# Altium footprint library Sajad_Altium_Library.PcbLib: 333 footprints (part 14 of 21)
Each footprint in its own frame and in the unit in brackets; x right, y up, seen from the top. Pads: shape width x height; smd on the part's side, far side on the other; paste and mask are expansions set on the pad; w line width, h text height; cw(c..) or ccw(c..) is an arc to the next point about the centre after c.
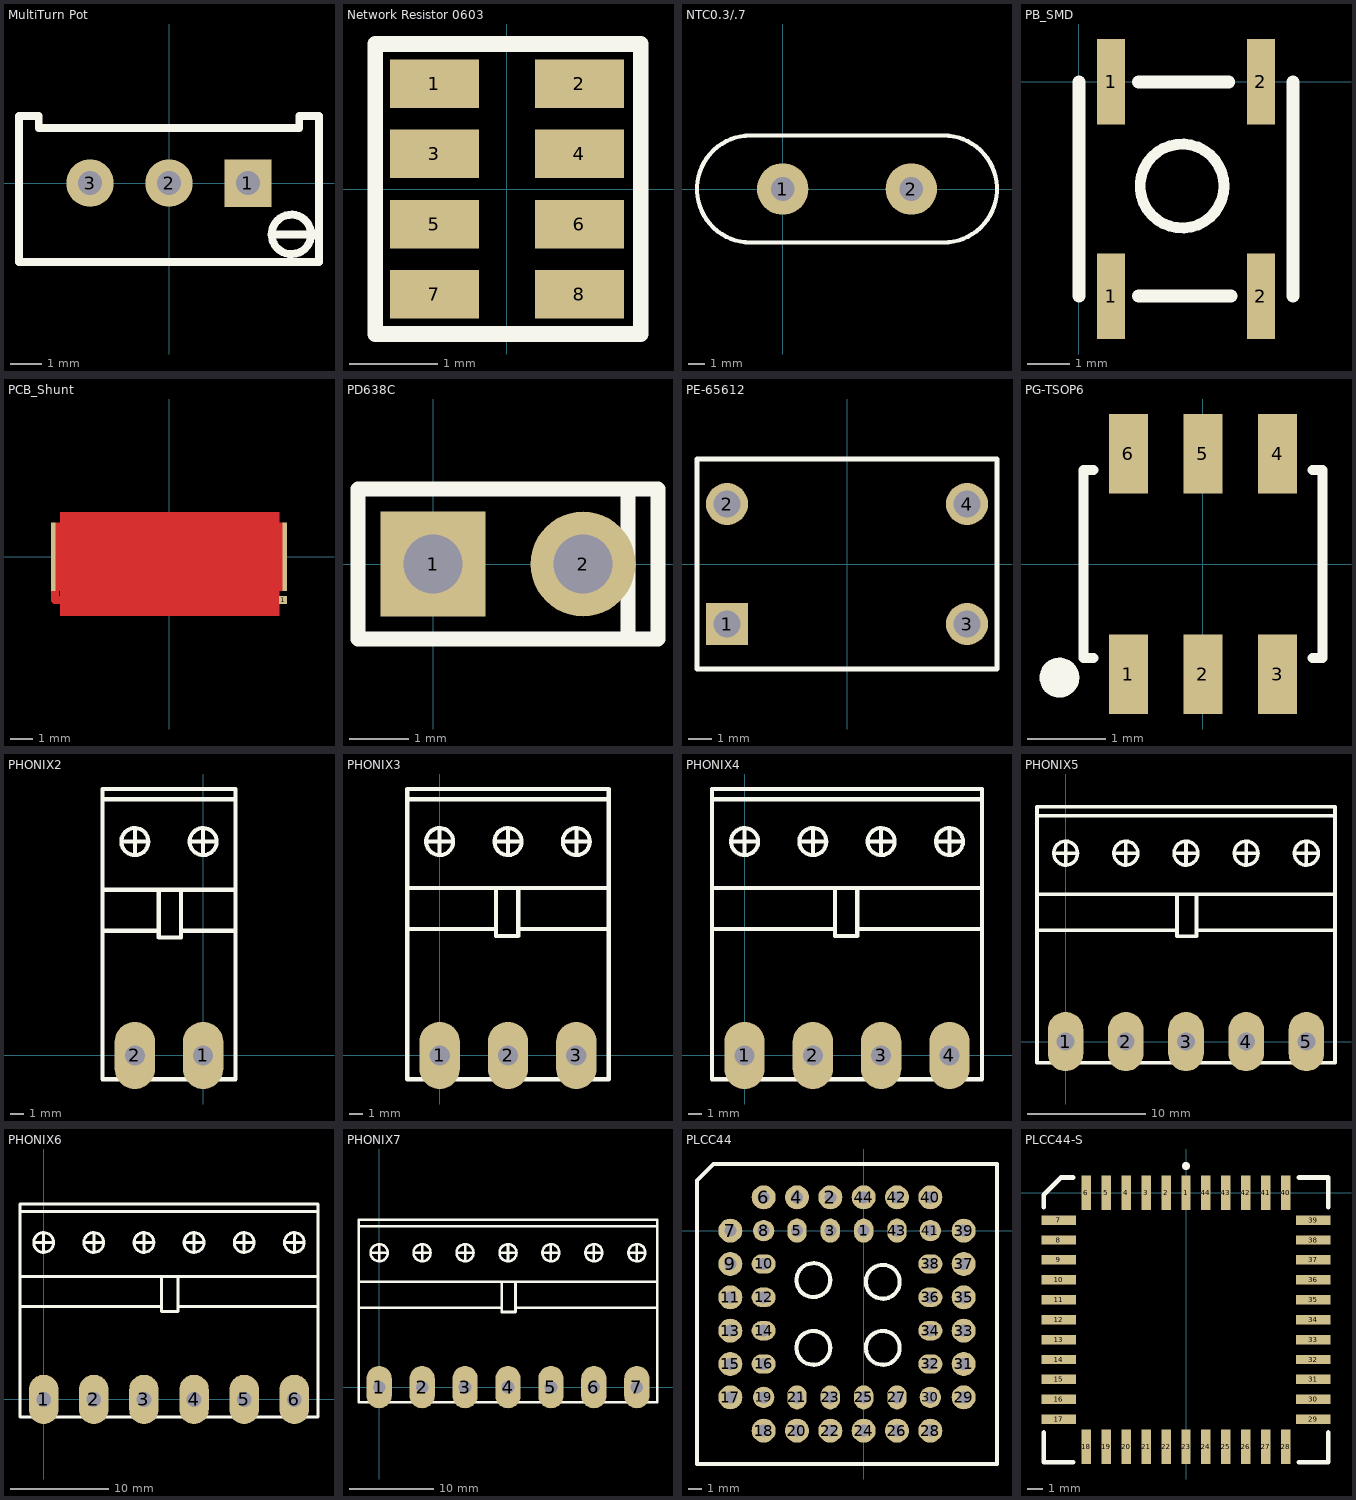
[diagram p13: the footprints below, top view; thin cyan lines are the x and y axes]

## MultiTurn Pot [mil] "MultiTurn Potentiometer"
pads (3):
  rect 60x60 hole 30: 1(100,0)
  round 60 hole 30: 2(0,0) 3(-100,0)
Top Overlay:
  circle w10: c155,-65 r25
  lines w10: 130,-65 175,-65 ; -190,-100 -190,85 -165,85 -165,70 0,70 165,70 165,85 190,85 190,-100 -190,-100
3D body: height 454.72, standoff -251.97, extent -187.6,-100.2 187.6,90

## Network Resistor 0603 [mm]
pads (8):
  rect 1.016x0.55 smd: 1(-0.825,1.2) 2(0.826,1.2) 3(-0.825,0.4) 4(0.826,0.4) 5(-0.825,-0.4) 6(0.826,-0.4) 7(-0.825,-1.2) 8(0.826,-1.2)
Top Overlay:
  lines w0.178: -1.499,-1.651 -1.499,1.651 1.524,1.651 1.524,-1.651 -1.499,-1.651
3D body: height 0.55, standoff 0, extent -0.8,-1.651 0.8,1.549

## NTC0.3/.7 [mil]
pads (2):
  round 120 hole 55: 1(0,0) 2(300,0)
Top Overlay:
  lines w10: -75,-125 cw(c-75,0) -75,125 375,125 cw(c375,0) 375,-125 -75,-125

## PB_SMD [mm]
pads (4):
  rect 0.65x2 smd: 1(0.75,-5) 1(0.75,0) 2(4.25,-5) 2(4.25,0)
Top Overlay:
  circle w0.254: c2.408,-2.431 r0.979
  lines w0.3: 0,-5 0,0 ; 1.393,-5 3.551,-5 ; 1.393,0 3.496,0 ; 5,-5 5,0

## PCB_Shunt [mm] "3miliOhm"
pads (3):
  rect 0.2x3 smd paste-0.1 mask-0.1: 1(-5.08,0) 2(5.08,0)
  rect 0.356x0.356 smd paste-0.1 mask-0.1: 1(5.002,-1.905)
Top Layer:
  rectangle: -5.004,-1.499 4.996,1.501
  pour cut-out: -4.775,1.956 -4.775,-2.591 4.839,-2.591 4.839,1.956
  lines w0.356: -5.004,-1.499 -5.004,-1.905 4.826,-1.905

## PD638C [mil] "2.75 ×5.25 mm Silicon PIN Photodiode"
pads (2):
  rect 70x70 hole 39.37: 1(0,0)
  round 70 hole 39.37: 2(100,0)
Top Overlay:
  lines w10: 130,-50 130,50 ; -50,-50 150,-50 150,50 -50,50 -50,-50
3D body: height 350, standoff -350, extent -42.4,-65 132.4,57.64

## PE-65612 [mil] "TRANSFORMERS FOR DIGITAL  AUDIO DATA TRANSMISSION"
pads (4):
  rect 70x70 hole 45: 1(-200,-100)
  round 70 hole 45: 2(-200,100) 3(200,-100) 4(200,100)
Top Overlay:
  lines w8: -250,-175 250,-175 250,175 -250,175 -250,-175
3D body: height 307.09, standoff -161.42, extent -250,-200.79 250,200.79

## PG-TSOP6 [mm]
pads (6):
  rect 0.5x1.016 smd: 1(-0.95,-1.403) 2(0,-1.403) 3(0.95,-1.403) 4(0.95,1.403) 5(0,1.403) 6(-0.95,1.403)
Top Overlay:
  circle w0.254: c-1.829,-1.448 r0.127
  lines w0.127: -1.397,-1.2 -1.524,-1.2 -1.524,0 -1.524,1.2 -1.397,1.2 ; 1.397,-1.2 1.524,-1.2 1.524,0 1.524,1.2 1.397,1.2
3D body: height 1.3, standoff 0, extent -1.5,-1.5 1.5,1.5

## PHONIX2 [mm]
pads (2):
  oval 3x5 hole 1.5: 1(0,0) 2(-5.08,0)
Top Overlay:
  circle w0.3: c-5.08,15.9 r1.006
  circle w0.3: c0,15.9 r1.006
  lines w0.3: -7.366,19.05 2.413,19.05 ; -5.944,15.9 -4.242,15.9 ; -5.08,15.062 -5.08,16.688 ; -0.864,15.9 0.838,15.9 ; 0,15.062 0,16.688
  lines w0.305: -7.493,9.271 -3.302,9.271 ; -7.493,12.319 2.413,12.319 ; -3.302,12.192 -3.302,8.763 -1.651,8.763 -1.651,12.319 ; -1.651,9.271 2.413,9.271 ; 2.337,-1.778 -7.493,-1.778 -7.493,19.812 2.413,19.812 2.413,-1.778

## PHONIX3 [mm]
pads (3):
  oval 3x5 hole 1.5: 1(0,0) 2(5.08,0) 3(10.16,0)
Top Overlay:
  circle w0.3: c10.16,15.9 r1.006
  circle w0.3: c0,15.9 r1.006
  circle w0.3: c5.08,15.9 r1.006
  lines w0.3: -2.286,19.05 12.573,19.05 ; -0.864,15.9 0.838,15.9 ; 0,15.062 0,16.688 ; 4.216,15.9 5.918,15.9 ; 5.08,15.062 5.08,16.688 ; 9.296,15.9 10.998,15.9 ; 10.16,15.062 10.16,16.688
  lines w0.305: -2.413,9.398 4.191,9.398 ; -2.413,12.446 12.573,12.446 ; 4.191,12.319 4.191,8.89 5.842,8.89 5.842,12.446 ; 5.842,9.398 12.573,9.398 ; -2.413,-1.778 12.573,-1.778 12.573,19.812 -2.413,19.812 -2.413,-1.778

## PHONIX4 [mm]
pads (4):
  oval 3x5 hole 1.5: 1(0,0) 2(5.08,0) 3(10.16,0) 4(15.24,0)
Top Overlay:
  circle w0.3: c15.24,15.9 r1.006
  circle w0.3: c10.16,15.9 r1.006
  circle w0.3: c0,15.9 r1.006
  circle w0.3: c5.08,15.9 r1.006
  lines w0.3: -2.286,19.05 17.653,19.05 ; -0.864,15.9 0.838,15.9 ; 0,15.062 0,16.688 ; 4.216,15.9 5.918,15.9 ; 5.08,15.062 5.08,16.688 ; 9.296,15.9 10.998,15.9 ; 10.16,15.062 10.16,16.688 ; 14.376,15.9 16.078,15.9 ; 15.24,15.062 15.24,16.688
  lines w0.305: -2.413,9.398 6.731,9.398 ; -2.413,12.446 17.653,12.446 ; 6.731,12.319 6.731,8.89 8.382,8.89 8.382,12.446 ; 8.382,9.398 17.653,9.398 ; -2.413,-1.778 17.653,-1.778 17.653,19.812 -2.413,19.812 -2.413,-1.778

## PHONIX5 [mm]
pads (5):
  oval 3x5 hole 1.5: 1(0,0) 2(5.08,0) 3(10.16,0) 4(15.24,0) 5(20.32,0)
Top Overlay:
  circle w0.3: c15.24,15.9 r1.006
  circle w0.3: c10.16,15.9 r1.006
  circle w0.3: c0,15.9 r1.006
  circle w0.3: c5.08,15.9 r1.006
  circle w0.3: c20.32,15.9 r1.006
  lines w0.3: -2.286,19.05 22.733,19.05 ; -0.864,15.9 0.838,15.9 ; 0,15.062 0,16.688 ; 4.216,15.9 5.918,15.9 ; 5.08,15.062 5.08,16.688 ; 9.296,15.9 10.998,15.9 ; 10.16,15.062 10.16,16.688 ; 14.376,15.9 16.078,15.9 ; 15.24,15.062 15.24,16.688 ; 19.456,15.9 21.158,15.9 ; 20.32,15.062 20.32,16.688
  lines w0.305: -2.413,9.398 9.398,9.398 ; -2.413,12.446 22.733,12.446 ; 9.398,12.319 9.398,8.89 11.049,8.89 11.049,12.446 ; 11.049,9.398 22.733,9.398 ; -2.413,-1.778 22.733,-1.778 22.733,19.812 -2.413,19.812 -2.413,-1.778

## PHONIX6 [mm]
pads (6):
  oval 3x5 hole 1.5: 1(0,0) 2(5.08,0) 3(10.16,0) 4(15.24,0) 5(20.32,0) 6(25.4,0)
Top Overlay:
  circle w0.3: c25.4,15.9 r1.006
  circle w0.3: c20.32,15.9 r1.006
  circle w0.3: c5.08,15.9 r1.006
  circle w0.3: c0,15.9 r1.006
  circle w0.3: c10.16,15.9 r1.006
  circle w0.3: c15.24,15.9 r1.006
  lines w0.3: -2.286,19.05 27.813,19.05 ; -0.864,15.9 0.838,15.9 ; 0,15.062 0,16.688 ; 4.216,15.9 5.918,15.9 ; 5.08,15.062 5.08,16.688 ; 9.296,15.9 10.998,15.9 ; 10.16,15.062 10.16,16.688 ; 14.376,15.9 16.078,15.9 ; 15.24,15.062 15.24,16.688 ; 19.456,15.9 21.158,15.9 ; 20.32,15.062 20.32,16.688 ; 24.536,15.9 26.238,15.9 ; 25.4,15.062 25.4,16.688
  lines w0.305: -2.413,9.398 11.938,9.398 ; -2.413,12.446 27.813,12.446 ; 11.938,12.319 11.938,8.89 13.589,8.89 13.589,12.446 ; 13.589,9.398 27.813,9.398 ; -2.413,-1.778 -2.413,19.812 27.813,19.812 27.813,-1.778 -2.413,-1.778

## PHONIX7 [mm]
pads (7):
  oval 3x5 hole 1.5: 1(0,0) 2(5.08,0) 3(10.16,0) 4(15.24,0) 5(20.32,0) 6(25.4,0) 7(30.48,0)
Top Overlay:
  circle w0.3: c15.24,15.9 r1.006
  circle w0.3: c10.16,15.9 r1.006
  circle w0.3: c0,15.9 r1.006
  circle w0.3: c5.08,15.9 r1.006
  circle w0.3: c20.32,15.9 r1.006
  circle w0.3: c25.4,15.9 r1.006
  circle w0.3: c30.48,15.9 r1.006
  lines w0.3: -2.286,19.05 32.893,19.05 ; -0.864,15.9 0.838,15.9 ; 0,15.062 0,16.688 ; 4.216,15.9 5.918,15.9 ; 5.08,15.062 5.08,16.688 ; 9.296,15.9 10.998,15.9 ; 10.16,15.062 10.16,16.688 ; 14.376,15.9 16.078,15.9 ; 15.24,15.062 15.24,16.688 ; 19.456,15.9 21.158,15.9 ; 20.32,15.062 20.32,16.688 ; 24.536,15.9 26.238,15.9 ; 25.4,15.062 25.4,16.688 ; 29.616,15.9 31.318,15.9 ; 30.48,15.062 30.48,16.688
  lines w0.305: -2.413,12.446 32.766,12.446 ; -2.286,9.398 14.478,9.398 ; 14.478,12.319 14.478,8.89 16.129,8.89 16.129,12.446 ; 16.129,9.398 32.893,9.398 ; -2.413,-1.778 32.893,-1.778 32.893,19.812 -2.413,19.812 -2.413,-1.778

## PLCC44 [mm]
pads (44):
  oval 1.45x1.8 hole 0.9: 1(0,0) 3(-2.5,0) 5(-5,0) 21(-5,-12.5) 23(-2.5,-12.5) 25(0,-12.5) 27(2.5,-12.5) 43(2.5,0)
  round 1.8 hole 0.9: 2(-2.5,2.5) 4(-5,2.5) 6(-7.5,2.5) 7(-10,0) 9(-10,-2.5) 11(-10,-5) 13(-10,-7.5) 15(-10,-10) 17(-10,-12.5) 18(-7.5,-15) 20(-5,-15) 22(-2.5,-15) 24(0,-15) 26(2.5,-15) 28(5,-15) 29(7.5,-12.5) 31(7.5,-10) 33(7.5,-7.5) 35(7.5,-5) 37(7.5,-2.5) 39(7.5,0) 40(5,2.5) 42(2.5,2.5) 44(0,2.5)
  round 1.6 hole 0.9: 8(-7.5,0) 19(-7.5,-12.5) 30(5,-12.5) 41(5,0)
  oval 1.8x1.45 hole 0.9: 10(-7.5,-2.5) 12(-7.5,-5) 14(-7.5,-7.5) 16(-7.5,-10) 32(5,-10) 34(5,-7.5) 36(5,-5) 38(5,-2.5)
Top Overlay:
  circle w0.305: c1.433,-8.789 r1.27
  circle w0.305: c-3.774,-8.789 r1.27
  circle w0.305: c1.433,-3.836 r1.27
  circle w0.305: c-3.774,-3.709 r1.27
  lines w0.305: -12.5,-17.5 10,-17.5 10,5 -11.25,5 -12.5,3.75 -12.5,-17.5

## PLCC44-S [mm]
pads (44):
  rect 0.6x2.2 smd: 1(0,0) 2(-1.27,0) 3(-2.54,0) 4(-3.81,0) 5(-5.08,0) 6(-6.35,0) 18(-6.35,-16.2) 19(-5.08,-16.2) 20(-3.81,-16.2) 21(-2.54,-16.2) 22(-1.27,-16.2) 23(0,-16.2) 24(1.27,-16.2) 25(2.54,-16.2) 26(3.81,-16.2) 27(5.08,-16.2) 28(6.35,-16.2) 40(6.35,0) 41(5.08,0) 42(3.81,0) 43(2.54,0) 44(1.27,0)
  rect 2.2x0.6 smd: 7(-8.1,-1.75) 8(-8.1,-3.02) 9(-8.1,-4.29) 10(-8.1,-5.56) 11(-8.1,-6.83) 12(-8.1,-8.1) 13(-8.1,-9.37) 14(-8.1,-10.64) 15(-8.1,-11.91) 16(-8.1,-13.18) 17(-8.1,-14.45) 29(8.1,-14.45) 30(8.1,-13.18) 31(8.1,-11.91) 32(8.1,-10.64) 33(8.1,-9.37) 34(8.1,-8.1) 35(8.1,-6.83) 36(8.1,-5.56) 37(8.1,-4.29) 38(8.1,-3.02) 39(8.1,-1.75)
Top Overlay:
  circle w0.25: c0,1.7 r0.125
  lines w0.305: -9.075,-15.298 -9.075,-17.187 -7.185,-17.187 ; -9.075,-0.928 -9.075,-0.137 -7.975,0.963 -7.185,0.963 ; 7.185,-17.187 9.075,-17.187 9.075,-15.298 ; 7.185,0.963 9.075,0.963 9.075,-0.928